# Altium footprint library 1.01-电阻.PcbLib: 75 footprints (part 1 of 5)
Each footprint in its own frame and in the unit in brackets; x right, y up, seen from the top. Pads: shape width x height; smd on the part's side, far side on the other; paste and mask are expansions set on the pad; w line width, h text height; cw(c..) or ccw(c..) is an arc to the next point about the centre after c.
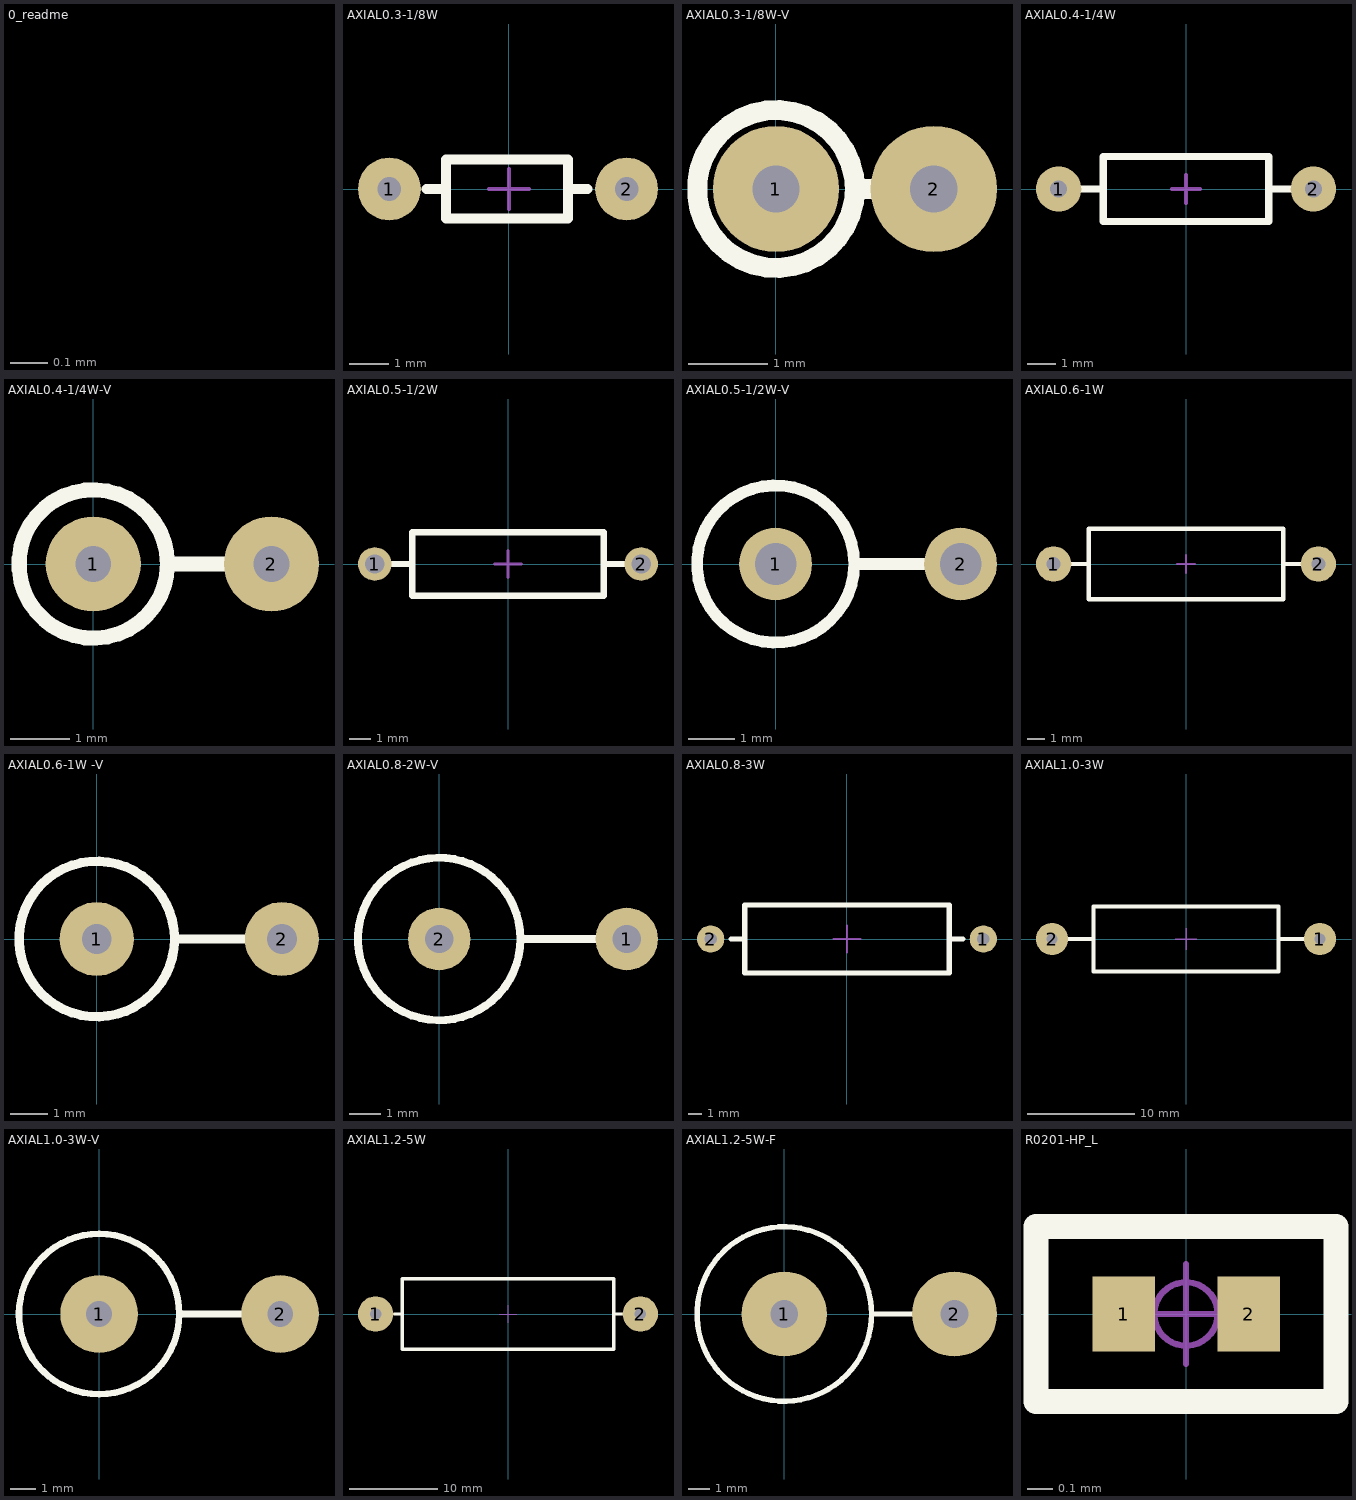
[diagram p0: the footprints below, top view; thin cyan lines are the x and y axes]

## 0_readme [mm] "封装库制作说明"
Top Overlay:
  text "封装库制作说明: /  / 1.本库二次整合了淘宝和论坛中最热的几套库，去除重复去粗取精，使之成为子集。 /  / 2.对包含的封装进行再次校对、补充，并对3D封装优中选优力求精致。 /  / 3.对杂乱的器件库进行了细致的分门别类，对库元件的命名做了标准化处理。 /  / 4.原理图库与PCB库命名统一对应，安装后可以直接使用，不用再设置封装映射。 /  / 5.该库基本上是最全的了，可满足绝大部分设计者，无需另行搜买，避免重复安装， / 分类错乱。 /  / 6.众所周知，大部分3D封装模型的最原始出处均为互联网的开源分享，且作者做了大 / 量的二次整理、修改、分类工作。故本库不涉及任何侵犯版权行为，以牟利为目的的 / 资料贩子请好自为之，勿扰。 /  / 7.本库旨在为初学者和设计者提供一个完备的设计资源基础，使其能够将精力着重放 / 在技术学习上而非重复造车轮。欢迎转载，但禁止商用。 /  / 8.欢迎加Q群514746572，获取开源更新，交流PCB设计技术。" at -3.7,0.8 h0.8
Top Solder:
  text "作者：冰凌猫 /  / 版本：v2.0_2021.03.26 /  / 开源更新和PCB学习答疑群：514746572" at -3.4,-4.1 h0.8

## AXIAL0.3-1/8W [mm] "脚距6mm，直径1.5mm     [ PCB学习群514746572 ]"
pads (2):
  round 1.6 hole 0.6: 1(-3.048,0) 2(3,0)
Top Overlay:
  lines w0.254: -2.1,0 -1.6,0 ; 2,0 1.5,0 ; -1.6,0 -1.6,0.75 1.5,0.75 1.5,0 ; -1.6,0 -1.6,-0.75 1.5,-0.75 1.5,0
Mechanical 15:
  lines w0.1: -0.508,0 0.508,0 ; 0,-0.508 0,0.508
3D body "rs_1-8w.STEP": height 1.52, standoff -3.49, extent -3.225,-0.757 3.225,0.757

## AXIAL0.3-1/8W-V [mm] "脚距2mm，直径1.5mm       [ PCB学习群514746572 ]"
pads (2):
  round 1.6 hole 0.6: 1(0,0) 2(2,0)
Top Overlay:
  circle w0.254: c0,0 r1
  lines w0.254: 1,0 2,0
3D body "rs_1-8w-v2.STEP": height 4.17, standoff -3.5, extent -0.757,-0.757 2.225,0.757

## AXIAL0.4-1/4W [mm] "脚距9mm，直径2.3mm     [ PCB学习群514746572]"
pads (2):
  round 1.6 hole 0.6: 1(-4.5,0) 2(4.5,0)
Top Overlay:
  lines w0.254: -3.683,0 -3.048,0 ; 3.048,0 3.683,0 ; -2.921,-1.143 2.921,-1.143 2.921,1.143 -2.921,1.143 -2.921,-1.143
Mechanical 15:
  lines w0.127: -0.508,0 0.508,0 ; 0,-0.508 0,0.508
3D body "rs_1-4w.STEP": height 2.32, standoff -3.49, extent -4.725,-1.16 4.725,1.16

## AXIAL0.4-1/4W-V [mm] "脚距3mm，直径2.3mm       [ PCB学习群514746572 ]"
pads (2):
  round 1.6 hole 0.6: 1(0,0) 2(3,0)
Top Overlay:
  circle w0.254: c0,0 r1.25
  lines w0.254: 1.25,0 2.5,0
3D body "rs_1-4w-v3.STEP": height 7.55, standoff -3.37, extent -1.16,-1.16 3.225,1.16

## AXIAL0.5-1/2W [mm] "脚距12.5mm，直径3mm      [ PCB学习群514746572 ]"
pads (2):
  round 1.575 hole 0.9: 1(-6.25,0) 2(6.25,0)
Top Overlay:
  lines w0.305: -5.5,0 -4.5,0 ; 4.5,0 5.5,0 ; -4.5,-1.5 -4.5,1.5 4.5,1.5 4.5,-1.5 -4.5,-1.5
Mechanical 15:
  lines w0.127: -0.635,0 0.635,0 ; 0,-0.635 0,0.635
3D body "rs_1-2w.STEP": height 3.11, standoff -3.4, extent -6.5,-1.51 6.5,1.51

## AXIAL0.5-1/2W-V [mil] "脚距4mm，直径3mm      [ PCB学习群514746572 ]"
pads (2):
  round 62 hole 35.43: 1(0,0) 2(157.48,0)
Top Overlay:
  circle w10: c0,0 r66.93
  lines w10: 66.93,0 133.86,0
3D body "rs_1-2w-v4.STEP": height 428.12, standoff -132.8, extent -59.44,-59.44 167.33,59.46

## AXIAL0.6-1W [mm] "脚距15mm，直径4mm      [ PCB学习群514746572 ]"
pads (2):
  round 2 hole 0.8: 1(-7.5,0) 2(7.5,0)
Top Overlay:
  lines w0.254: -6.5,0 -5.5,0 ; 5.5,0 6.5,0 ; -5.5,-2 5.5,-2 5.5,2 -5.5,2 -5.5,-2
Mechanical 15:
  lines w0.1: -0.508,0 0.508,0 ; 0,-0.508 0,0.508
3D body "RS_1W.STEP": height 4.11, standoff -3.4, extent -7.8,-2.01 7.8,2.01

## AXIAL0.6-1W -V [mm] "脚距5mm，直径4mm      [ PCB学习群514746572 ]"
pads (2):
  round 2 hole 0.8: 1(0,0) 2(5,0)
Top Overlay:
  circle w0.254: c0,0 r2.1
  lines w0.254: 2.1,0 4.2,0
3D body "RS_1W-v5.STEP": height 13.42, standoff -3.37, extent -2.01,-2.001 5.3,2.002

## AXIAL0.8-2W-V [mm] "脚距6mm，直径5mm      [ PCB学习群514746572 ]"
pads (2):
  round 2 hole 0.9: 1(6,0) 2(0,0)
Top Overlay:
  circle w0.254: c0,0 r2.6
  lines w0.254: 2.6,0 5.2,0
3D body "RS_2W_v.STEP": height 17.72, standoff -3.37, extent -2.51,-2.499 6.4,2.499

## AXIAL0.8-3W [mm] "脚距20mm，直径5mm      [ PCB学习群514746572 ]"
pads (2):
  round 2 hole 0.9: 1(10,0) 2(-10,0)
Top Overlay:
  lines w0.381: -8.5,0 -7.5,0 ; 7.628,0 8.5,0 ; -7.5,-2.5 7.5,-2.5 7.5,2.5 -7.5,2.5 -7.5,-2.5
Mechanical 15:
  lines w0.127: -1.016,0 1.016,0 ; 0,-1.016 0,1.016
3D body "RS-2W.STEP": height 5.11, standoff -3.4, extent -10.4,-2.51 10.4,2.51

## AXIAL1.0-3W [mm] "脚距25mm，直径6mm      [ PCB学习群514746572 ]"
pads (2):
  round 3 hole 1: 1(12.5,0) 2(-12.5,0)
Top Overlay:
  lines w0.381: -10.922,0 -8.636,0 ; 8.636,0 11.049,0 ; -8.636,-3.048 -8.636,3.048 8.636,3.048 8.636,-3.048 -8.636,-3.048
Mechanical 15:
  lines w0.127: -1.016,0 1.016,0 ; 0,-1.016 0,1.016
3D body "RS_3W.STEP": height 6.11, standoff -3.4, extent -12.9,-3.01 12.9,3.01

## AXIAL1.0-3W-V [mm] "脚距7mm，直径6mm      [ PCB学习群514746572 ]"
pads (2):
  round 3 hole 1: 1(0,0) 2(7,0)
Top Overlay:
  circle w0.254: c0,0 r3.1
  lines w0.254: 3.1,0 6.2,0
3D body "RS_3W-v7.STEP": height 20.02, standoff -3.37, extent -3.01,-2.997 7.4,2.997

## AXIAL1.2-5W [mm] "脚距30mm，直径8mm      [ PCB学习群514746572 ]"
pads (2):
  round 4 hole 1.3: 1(-15,0) 2(15,0)
Top Overlay:
  lines w0.381: -12.922,0 -12,0 ; 12,0 13,0 ; -12,-4 -12,4 12,4 12,-4 -12,-4
Mechanical 15:
  lines w0.127: -1.016,0 1.016,0 ; 0,-1.016 0,1.016
3D body "RS_5W.STEP": height 8.11, standoff -3.4, extent -15.5,-4.01 15.5,4.01

## AXIAL1.2-5W-F [mm] "脚距30mm，直径8mm      [ PCB学习群514746572 ]"
pads (2):
  round 4 hole 1.3: 1(0,0) 2(8,0)
Top Overlay:
  circle w0.254: c0,0 r4.1
  lines w0.254: 4.1,0 6.25,0
3D body "RS_5W-v8.STEP": height 27.42, standoff -3.37, extent -4.01,-3.993 8.5,3.993

## R0201-HP_L [mm] "1/20W高精度贴片电阻      [ PCB学习群514746572 ]"
pads (2):
  rect 0.25x0.3 smd: 1(-0.25,0) 2(0.25,0)
Top Overlay:
  lines w0.102: -0.6,-0.35 0.6,-0.35 0.6,0.35 -0.6,0.35 -0.6,-0.35
Mechanical 15:
  circle w0.025: c0,0 r0.127
  lines w0.025: -0.2,0 0.2,0 ; 0,-0.2 0,0.2
3D body "R0201-HP.STEP": height 0.23, standoff 0, extent -0.3,-0.15 0.3,0.15